# Altium footprint library Connectors FPC.PcbLib: 26 footprints (part 1 of 2)
Each footprint in its own frame and in the unit in brackets; x right, y up, seen from the top. Pads: shape width x height; smd on the part's side, far side on the other; paste and mask are expansions set on the pad; w line width, h text height; cw(c..) or ccw(c..) is an arc to the next point about the centre after c.
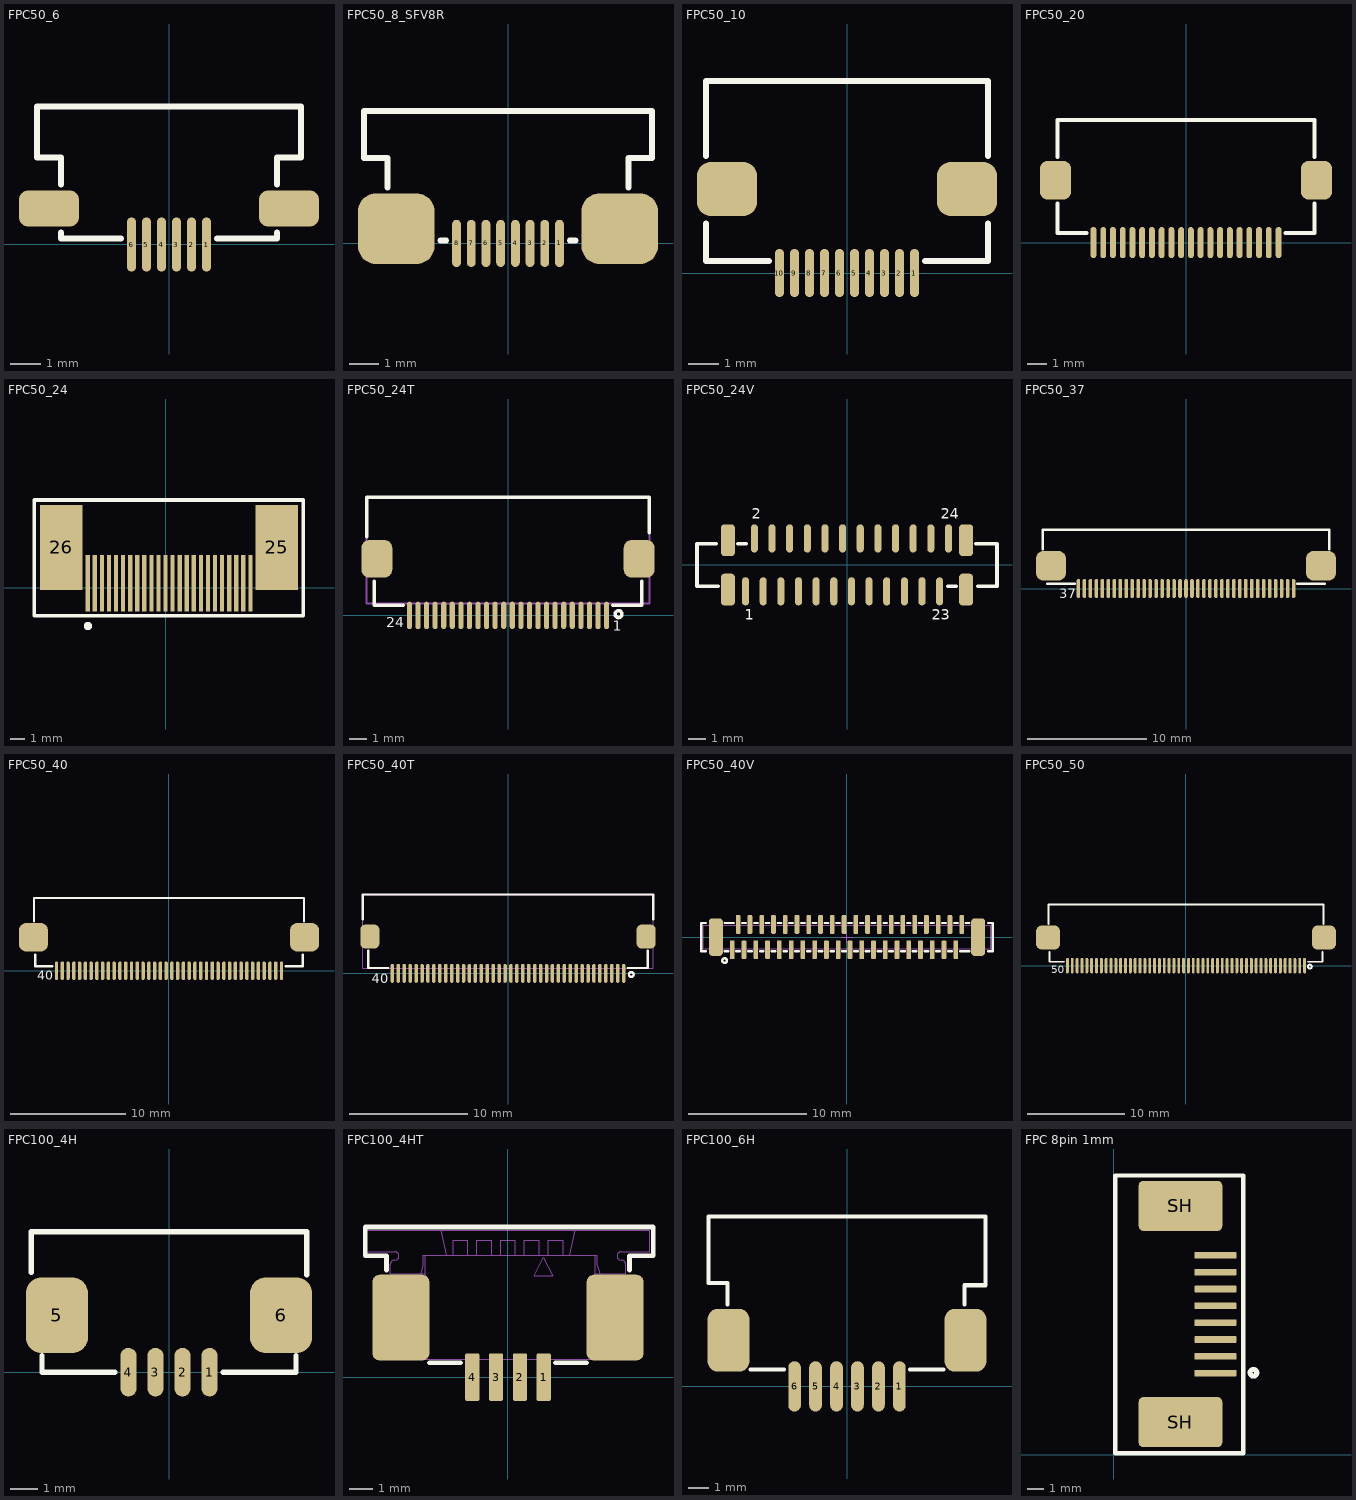
[diagram p0: the footprints below, top view; thin cyan lines are the x and y axes]

## FPC50_6 [mm] "FFC-FPC 6pin pitch: 0.5mm FCI SFV6R1STBE1HLF"
height 3
pads (8):
  oval 0.3x1.8 smd mask+0.075: 1(1.25,0) 2(0.75,0) 3(0.25,0) 4(-0.25,0) 5(-0.75,0) 6(-1.25,0)
  rrect50% 2x1.2 smd: ""(-4,1.2) ""(4,1.2)
Top Overlay:
  lines w0.2: -3.6,0.4 -3.6,0.2 -1.6,0.2 ; -3.6,2 -3.6,2.9 -4.4,2.9 -4.4,4.6 4.4,4.6 4.4,2.9 3.6,2.9 3.6,2 ; 1.6,0.2 3.6,0.2 3.6,0.4
3D body "sfv6r1stbe1hlf.stp": height 1.9, standoff 0.03, extent -4.25,-0.4 4.25,4.5

## FPC50_8_SFV8R [mm] "FPC 8pin pitch: 0.5mm FCI SFV8R-2STE1HLF"
pads (10):
  oval 0.3x1.6 smd mask+0.05: 1(1.75,0) 2(1.25,0) 3(0.75,0) 4(0.25,0) 5(-0.25,0) 6(-0.75,0) 7(-1.25,0) 8(-1.75,0)
  rrect50% 2.6x2.4 smd: ""(-3.8,0.5) ""(3.8,0.5)
Top Overlay:
  lines w0.2: -4.1,1.9 -4.1,2.9 -4.9,2.9 -4.9,4.5 4.9,4.5 4.9,2.9 4.1,2.9 4.1,1.9 ; -2.3,0.1 -2.1,0.1 ; 2.1,0.1 2.3,0.1
3D body "ssfv8r_2stlf.stp": height 1.82, standoff -0.05, extent -4.75,-0.5 4.75,4.4

## FPC50_10 [mm] "FPC, 0.50mm, SMT,RA Bot. Contact, WE 687110149022"
height 7.62
pads (12):
  oval 0.3x1.6 smd mask+0.05: 1(2.25,0) 2(1.75,0) 3(1.25,0) 4(0.75,0) 5(0.25,0) 6(-0.25,0) 7(-0.75,0) 8(-1.25,0) 9(-1.75,0) 10(-2.25,0)
  rrect50% 2x1.8 smd: ""(-4,2.8) ""(4,2.8)
Top Overlay:
  lines w0.2: -4.7,1.65 -4.7,0.4 -2.6,0.4 ; -4.7,3.9 -4.7,6.4 4.7,6.4 4.7,3.9 ; 2.6,0.4 4.7,0.4 4.7,1.65
3D body "687110149022.stp": height 2.25, standoff 0, extent -4.55,-0.225 4.55,6.275

## FPC50_20 [mm] "FH12-20S-0.5SH FFC-FPC pitch: 0.5mm"
height 3
pads (22):
  oval 0.3x1.6 smd mask+0.05: 1(4.75,0) 2(4.25,0) 3(3.75,0) 4(3.25,0) 5(2.75,0) 6(2.25,0) 7(1.75,0) 8(1.25,0) 9(0.75,0) 10(0.25,0) 11(-0.25,0) 12(-0.75,0) 13(-1.25,0) 14(-1.75,0) 15(-2.25,0) 16(-2.75,0) 17(-3.25,0) 18(-3.75,0) 19(-4.25,0) 20(-4.75,0)
  rrect50% 1.6x2 smd: ""(-6.7,3.2) ""(6.7,3.2)
Top Overlay:
  lines w0.2: -6.6,2 -6.6,0.5 -5.1,0.5 ; -6.6,4.4 -6.6,6.3 6.6,6.3 6.6,4.4 ; 5.1,0.5 6.6,0.5 6.6,2
3D body "FH12-20S-0.5SH.stp": height 2.14, standoff 0.04, extent -7.05,-0.2 7.05,6.2

## FPC50_24 [mm] "FPC, FH12 Series; 24 Position; 0.5mm, Bottom Contact, FH12F-24S-0.5SH"
pads (26):
  rect 0.3x4 smd: 1(-5.51,0.31) 2(-5.01,0.31) 3(-4.51,0.31) 4(-4.01,0.31) 5(-3.51,0.31) 6(-3.01,0.31) 7(-2.51,0.31) 8(-2.01,0.31) 9(-1.51,0.31) 10(-1.01,0.31) 11(-0.51,0.31) 12(-0.01,0.31) 13(0.49,0.31) 14(0.99,0.31) 15(1.49,0.31) 16(1.99,0.31) 17(2.49,0.31) 18(2.99,0.31) 19(3.49,0.31) 20(3.99,0.31) 21(4.49,0.31) 22(4.99,0.31) 23(5.49,0.31) 24(5.99,0.31)
  rect 3x6 smd: 25(7.84,2.86) 26(-7.37,2.86)
Top Overlay:
  circle w0.3: c-5.5,-2.7 r0.141
  lines w0.254: -9.3,-1.97 9.72,-1.97 9.72,6.21 -9.3,6.21 -9.3,-1.97
3D body "5603.stp": height 2, standoff -0.04, extent -9.08,-0.83 9.52,5.97

## FPC50_24T [mm] "Connector; FH12 Series; 24 Position; 0.5mm, Top Contact, FH12A-24S-0.5SH(55)"
height 2
pads (26):
  oval 0.3x1.6 smd mask+0.05: 1(5.75,0) 2(5.25,0) 3(4.75,0) 4(4.25,0) 5(3.75,0) 6(3.25,0) 7(2.75,0) 8(2.25,0) 9(1.75,0) 10(1.25,0) 11(0.75,0) 12(0.25,0) 13(-0.25,0) 14(-0.75,0) 15(-1.25,0) 16(-1.75,0) 17(-2.25,0) 18(-2.75,0) 19(-3.25,0) 20(-3.75,0) 21(-4.25,0) 22(-4.75,0) 23(-5.25,0) 24(-5.75,0)
  rrect50% 1.8x2.2 smd: ""(-7.65,3.3) ""(7.65,3.3)
Top Overlay:
  circle w0.2: c6.45,0.075 r0.2
  lines w0.2: -8.25,4.6 -8.25,6.9 8.25,6.9 8.25,4.825 ; -7.8,2 -7.8,0.6 -6.1,0.6 ; 6.1,0.6 7.8,0.6 7.8,2
  text "1" at 6.1,-0.9 h0.6
  text "24" at -7.1,-0.7 h0.6
Mechanical 13:
  lines w0.1: -8.25,0.7 8.25,0.7 8.25,6.9 -8.25,6.9 -8.25,0.7
3D body "FH12A-24S-0.5SH.stp": height 2.05, standoff -0.1, extent -8.25,-0.2 8.25,6.8

## FPC50_24V [mm] "Connector; FH12 Series; 24 Position; 0.5mm, Vertical, FH12-24S-0.5SV"
height 4.85
pads (28):
  oval 0.4x1.6 smd: 1(-5.75,-1.5) 2(-5.25,1.5) 3(-4.75,-1.5) 4(-4.25,1.5) 5(-3.75,-1.5) 6(-3.25,1.5) 7(-2.75,-1.5) 8(-2.25,1.5) 9(-1.75,-1.5) 10(-1.25,1.5) 11(-0.75,-1.5) 12(-0.25,1.5) 13(0.25,-1.5) 14(0.75,1.5) 15(1.25,-1.5) 16(1.75,1.5) 17(2.25,-1.5) 18(2.75,1.5) 19(3.25,-1.5) 20(3.75,1.5) 21(4.25,-1.5) 22(4.75,1.5) 23(5.25,-1.5) 24(5.75,1.5)
  rrect50% 0.8x1.8 smd: ""(-6.75,-1.4) ""(-6.75,1.4) ""(6.75,-1.4) ""(6.75,1.4)
Top Overlay:
  lines w0.2: -7.4,1.2 -8.5,1.2 -8.5,-1.2 -7.3,-1.2 ; -6.2,1.2 -5.7,1.2 ; 5.7,-1.2 6.2,-1.2 ; 7.3,1.2 8.5,1.2 8.5,-1.2 7.4,-1.2
  text "1" at -5.8,-3.1 h0.6
  text "2" at -5.4,2.6 h0.6
  text "24" at 5.3,2.6 h0.6
  text "23" at 4.8,-3.1 h0.6
3D body "FH12-24S-0.5SV.stp": height 5.48, standoff -0.03, extent -7.7,-1.8 7.7,2

## FPC50_37 [mm] "FPC, pitch: 0.5mm, TE 3-1734592-7"
height 3
pads (39):
  oval 0.3x1.6 smd mask+0.05: 1(9,0) 2(8.5,0) 3(8,0) 4(7.5,0) 5(7,0) 6(6.5,0) 7(6,0) 8(5.5,0) 9(5,0) 10(4.5,0) 11(4,0) 12(3.5,0) 13(3,0) 14(2.5,0) 15(2,0) 16(1.5,0) 17(1,0) 18(0.5,0) 19(0,0) 20(-0.5,0) 21(-1,0) 22(-1.5,0) 23(-2,0) 24(-2.5,0) 25(-3,0) 26(-3.5,0) 27(-4,0) 28(-4.5,0) 29(-5,0) 30(-5.5,0) 31(-6,0) 32(-6.5,0) 33(-7,0) 34(-7.5,0) 35(-8,0) 36(-8.5,0) 37(-9,0)
  rrect50% 2.5x2.5 smd: ""(-11.3,1.9) ""(11.3,1.9)
Top Overlay:
  lines w0.2: -12,3.3 -12,4.9 12,4.9 12,3.3 ; -11.6,0.4 -9.3,0.4 ; 9.3,0.4 11.6,0.4
  text "37" at -10.6,-0.8 h0.8
3D body "3-1734592-7.stp": height 2.05, standoff 0, extent -11.965,-0.3 11.965,4.81

## FPC50_40 [mm] "FPC, pitch: 0.5mm, FH12-40S-0.5SH, molex 54132-4062"
height 3
pads (42):
  oval 0.3x1.6 smd mask+0.05: 1(9.75,0) 2(9.25,0) 3(8.75,0) 4(8.25,0) 5(7.75,0) 6(7.25,0) 7(6.75,0) 8(6.25,0) 9(5.75,0) 10(5.25,0) 11(4.75,0) 12(4.25,0) 13(3.75,0) 14(3.25,0) 15(2.75,0) 16(2.25,0) 17(1.75,0) 18(1.25,0) 19(0.75,0) 20(0.25,0) 21(-0.25,0) 22(-0.75,0) 23(-1.25,0) 24(-1.75,0) 25(-2.25,0) 26(-2.75,0) 27(-3.25,0) 28(-3.75,0) 29(-4.25,0) 30(-4.75,0) 31(-5.25,0) 32(-5.75,0) 33(-6.25,0) 34(-6.75,0) 35(-7.25,0) 36(-7.75,0) 37(-8.25,0) 38(-8.75,0) 39(-9.25,0) 40(-9.75,0)
  rrect50% 2.5x2.5 smd: ""(-11.75,2.9) ""(11.75,2.9)
Top Overlay:
  lines w0.2: -11.7,4.3 -11.7,6.3 11.7,6.3 11.7,4.3 ; -11.6,1.4 -11.6,0.4 -10.1,0.4 ; 10.1,0.4 11.6,0.4 11.6,1.4
  text "40" at -11.4,-0.8 h0.8
3D body "FH12-40S-0.5SH.stp": height 2.09, standoff -0.01, extent -12.05,-0.3 12.05,6.1

## FPC50_40T [mm] "FPC, FH12 Series; 40 Position; 0.5mm, Top Contact"
height 2
pads (42):
  oval 0.3x1.6 smd mask+0.05: 1(9.75,0) 2(9.25,0) 3(8.75,0) 4(8.25,0) 5(7.75,0) 6(7.25,0) 7(6.75,0) 8(6.25,0) 9(5.75,0) 10(5.25,0) 11(4.75,0) 12(4.25,0) 13(3.75,0) 14(3.25,0) 15(2.75,0) 16(2.25,0) 17(1.75,0) 18(1.25,0) 19(0.75,0) 20(0.25,0) 21(-0.25,0) 22(-0.75,0) 23(-1.25,0) 24(-1.75,0) 25(-2.25,0) 26(-2.75,0) 27(-3.25,0) 28(-3.75,0) 29(-4.25,0) 30(-4.75,0) 31(-5.25,0) 32(-5.75,0) 33(-6.25,0) 34(-6.75,0) 35(-7.25,0) 36(-7.75,0) 37(-8.25,0) 38(-8.75,0) 39(-9.25,0) 40(-9.75,0)
  rrect50% 1.6x2 smd: ""(-11.65,3.1) ""(11.65,3.1)
Top Overlay:
  circle w0.2: c10.4,-0.1 r0.2
  lines w0.2: -12.25,4.57 -12.25,6.645 12.25,6.645 12.25,4.57 ; -11.8,1.9 -11.8,0.445 -10.1,0.445 ; 10.1,0.445 11.8,0.445 11.8,1.9
  text "40" at -11.5,-0.855 h0.8
Mechanical 13:
  lines w0.1: -12.25,0.445 -12.25,6.645 12.25,6.645 12.25,0.445 -12.25,0.445
3D body "FH12A-40S-0.5SH.stp": height 2.05, standoff -0.1, extent -12.25,-0.3 12.25,6.7

## FPC50_40V [mm] "FPC, FH12 Series; 40 Position; 0.5mm,Vertical, FH12-40S-0.5SVA"
pads (42):
  rrect50% 0.4x1.6 smd mask+0.1: 1(-9.75,-1.075) 2(-9.25,1.075) 3(-8.75,-1.075) 4(-8.25,1.075) 5(-7.75,-1.075) 6(-7.25,1.075) 7(-6.75,-1.075) 8(-6.25,1.075) 9(-5.75,-1.075) 10(-5.25,1.075) 11(-4.75,-1.075) 12(-4.25,1.075) 13(-3.75,-1.075) 14(-3.25,1.075) 15(-2.75,-1.075) 16(-2.25,1.075) 17(-1.75,-1.075) 18(-1.25,1.075) 19(-0.75,-1.075) 20(-0.25,1.075) 21(0.25,-1.075) 22(0.75,1.075) 23(1.25,-1.075) 24(1.75,1.075) 25(2.25,-1.075) 26(2.75,1.075) 27(3.25,-1.075) 28(3.75,1.075) 29(4.25,-1.075) 30(4.75,1.075) 31(5.25,-1.075) 32(5.75,1.075) 33(6.25,-1.075) 34(6.75,1.075) 35(7.25,-1.075) 36(7.75,1.075) 37(8.25,-1.075) 38(8.75,1.075) 39(9.25,-1.075) 40(9.75,1.075)
  rrect50% 1.2x3.2 smd: ""(-11.15,0) ""(11.15,0)
Top Overlay:
  circle w0.2: c-10.4,-2 r0.2
  lines w0.2: -12,-1.2 -12.4,-1.2 -12.4,1.2 -12,1.2 ; -10.4,-1.2 -10.1,-1.2 ; -10.4,1.2 -9.6,1.2 ; -9.4,-1.2 -9.1,-1.2 ; -8.9,1.2 -8.6,1.2 ; -8.4,-1.2 -8.1,-1.2 ; -7.9,1.2 -7.6,1.2 ; -7.4,-1.2 -7.1,-1.2 ; -6.9,1.2 -6.6,1.2 ; -6.4,-1.2 -6.1,-1.2 ; -5.9,1.2 -5.6,1.2 ; -5.4,-1.2 -5.1,-1.2 ; -4.9,1.2 -4.6,1.2 ; -4.4,-1.2 -4.1,-1.2 ; -3.9,1.2 -3.6,1.2 ; -3.4,-1.2 -3.1,-1.2 ; -2.9,1.2 -2.6,1.2 ; -2.4,-1.2 -2.1,-1.2 ; -1.9,1.2 -1.6,1.2 ; -1.4,-1.2 -1.1,-1.2 ; -0.9,1.2 -0.6,1.2 ; -0.4,-1.2 -0.1,-1.2 ; 0.1,1.2 0.4,1.2 ; 0.6,-1.2 0.9,-1.2 ; 1.1,1.2 1.4,1.2 ; 1.6,-1.2 1.9,-1.2 ; 2.1,1.2 2.4,1.2 ; 2.6,-1.2 2.9,-1.2 ; 3.1,1.2 3.4,1.2 ; 3.6,-1.2 3.9,-1.2 ; 4.1,1.2 4.4,1.2 ; 4.6,-1.2 4.9,-1.2 ; 5.1,1.2 5.4,1.2 ; 5.6,-1.2 5.9,-1.2 ; 6.1,1.2 6.4,1.2 ; 6.6,-1.2 6.9,-1.2 ; 7.1,1.2 7.4,1.2 ; 7.6,-1.2 7.9,-1.2 ; 8.1,1.2 8.4,1.2 ; 8.6,-1.2 8.9,-1.2 ; 9.1,1.2 9.4,1.2 ; 9.6,-1.2 10.4,-1.2 ; 10.1,1.2 10.4,1.2 ; 12,-1.2 12.4,-1.2 12.4,1.2 12,1.2
Mechanical 13:
  lines w0.1: -12.2,-1 -12.2,1 12.2,1 12.2,-1 -12.2,-1
Mechanical 15:
  lines w0.1: -0.5,0 0.5,0 ; 0,-0.5 0,0.5
3D body "ZIF connector.stp": height 4.47, standoff -0.02, extent -12.118,-1.454 12.182,1.483

## FPC50_50 [mm] "FPC, pitch: 0.5mm, FH12-50S-0.5SH"
height 3
pads (52):
  oval 0.3x1.6 smd mask+0.05: 1(12.25,0) 2(11.75,0) 3(11.25,0) 4(10.75,0) 5(10.25,0) 6(9.75,0) 7(9.25,0) 8(8.75,0) 9(8.25,0) 10(7.75,0) 11(7.25,0) 12(6.75,0) 13(6.25,0) 14(5.75,0) 15(5.25,0) 16(4.75,0) 17(4.25,0) 18(3.75,0) 19(3.25,0) 20(2.75,0) 21(2.25,0) 22(1.75,0) 23(1.25,0) 24(0.75,0) 25(0.25,0) 26(-0.25,0) 27(-0.75,0) 28(-1.25,0) 29(-1.75,0) 30(-2.25,0) 31(-2.75,0) 32(-3.25,0) 33(-3.75,0) 34(-4.25,0) 35(-4.75,0) 36(-5.25,0) 37(-5.75,0) 38(-6.25,0) 39(-6.75,0) 40(-7.25,0) 41(-7.75,0) 42(-8.25,0) 43(-8.75,0) 44(-9.25,0) 45(-9.75,0) 46(-10.25,0) 47(-10.75,0) 48(-11.25,0) 49(-11.75,0) 50(-12.25,0)
  rrect50% 2.5x2.5 smd: ""(-14.25,2.9) ""(14.25,2.9)
Top Overlay:
  circle w0.2: c12.8,-0.1 r0.2
  lines w0.2: -14.2,4.3 -14.2,6.3 14.2,6.3 14.2,4.3 ; -14.1,1.4 -14.1,0.4 -12.6,0.4 ; 12.6,0.4 14.1,0.4 14.1,1.4
  text "50" at -13.9,-0.8 h0.8
3D body "FH12-50S-0.5SH.stp": height 2.09, standoff -0.01, extent -14.55,-0.3 14.55,6.1

## FPC100_4H [mm] "FPC, 1mm, Horizental, Bot. Contact, Molex 200529-0040"
height 0.8
pads (6):
  oval 0.6x1.8 smd: 1(1.5,0) 2(0.5,0) 3(-0.5,0) 4(-1.5,0)
  rrect50% 2.3x2.8 smd: 5(-4.15,2.1) 6(4.15,2.1)
Top Overlay:
  lines w0.2: -5.1,3.7 -5.1,5.2 5.1,5.2 5.1,3.6 ; -4.7,0.6 -4.7,0 -2,0 ; 2,0 4.7,0 4.7,0.6
3D body "2005290040.stp": height 1.93, standoff -0.03, extent -5,-0.25 5,5.05

## FPC100_4HT [mm] "TE Connectivity 4-pin ZIF connector TE84953-4"
height 2.74
pads (6):
  rrect25% 0.6x2 smd: 1(1.5,0) 2(0.5,0) 3(-0.5,0) 4(-1.5,0)
  rrect25% 2.4x3.6 smd: ""(-4.5,2.5) ""(4.5,2.5)
Top Overlay:
  lines w0.2: -5.1,4.5 -5.1,5.1 -6,5.1 -6,6.3 6.1,6.3 6.1,5.1 5.1,5.1 5.1,4.5 ; -3.3,0.6 -2,0.6 ; 2,0.6 3.3,0.6
Mechanical 13:
  lines w0.05: -4.56,0.75 -4.56,4.25 -3.47,4.25 -3.47,5.12 ; -4.56,3.2 -4.18,3.2 ; -4.28,4.25 -4.18,3.877 -4.18,2.98 -3.93,2.98 ; -4.229,4.25 -4.232,4.26 -5.072,4.26 ccw(c-5.072,4.16) -5.172,4.16 -5.172,3.859 ccw(c-5.072,3.859) -5.072,3.759 -4.762,3.759 cw(c-4.762,3.659) -4.662,3.659 -4.662,3.357 cw(c-4.762,3.357) -4.762,3.257 -5.072,3.257 ccw(c-5.072,3.157) -5.172,3.157 -5.172,2.856 ccw(c-5.072,2.856) -5.072,2.756 -4.762,2.756 cw(c-4.762,2.656) -4.662,2.656 -4.662,2.355 cw(c-4.762,2.355) -4.762,2.255 -5.072,2.255 ccw(c-5.072,2.155) -5.172,2.155 -5.172,1.853 ccw(c-5.072,1.853) -5.072,1.753 -4.762,1.753 cw(c-4.762,1.653) -4.662,1.653 -4.662,1.352 cw(c-4.762,1.352) -4.762,1.252 -5.072,1.252 ccw(c-5.072,1.152) -5.172,1.152 -5.172,0.85 ccw(c-5.072,0.85) -5.072,0.75 5.072,0.75 ccw(c5.072,0.85) 5.172,0.85 5.172,1.152 ccw(c5.072,1.152) 5.072,1.252 4.762,1.252 cw(c4.762,1.352) 4.662,1.352 4.662,1.653 cw(c4.762,1.653) 4.762,1.753 5.072,1.753 ccw(c5.072,1.853) 5.172,1.853 5.172,2.155 ccw(c5.072,2.155) 5.072,2.255 4.762,2.255 cw(c4.762,2.355) 4.662,2.355 4.662,2.656 cw(c4.762,2.656) 4.762,2.756 5.072,2.756 ccw(c5.072,2.856) 5.172,2.856 5.172,3.157 ccw(c5.072,3.157) 5.072,3.257 4.762,3.257 cw(c4.762,3.357) 4.662,3.357 4.662,3.659 cw(c4.762,3.659) 4.762,3.759 5.072,3.759 ccw(c5.072,3.859) 5.172,3.859 5.172,4.16 ccw(c5.072,4.16) 5.072,4.26 3.982,4.26 3.982,4.25 ; -3.93,0.75 -3.93,3.877 -3.83,4.25 ; -3.646,4.33 -3.55,4.69 -3.55,5.12 3.75,5.12 3.75,4.69 3.847,4.33 ; -3.47,4.33 -4.94,4.33 -4.94,4.73 cw(c-4.76,4.73) -4.76,4.91 ccw(c-4.76,5.09) -4.76,5.27 -5.96,5.27 -5.96,6.16 5.96,6.16 5.96,5.27 4.76,5.27 ccw(c4.76,5.09) 4.76,4.91 cw(c4.76,4.73) 4.94,4.73 4.94,4.33 3.67,4.33 ; -2.82,6.16 -2.59,5.12 ; -2.309,5.12 -2.309,5.75 -1.689,5.75 -1.689,5.12 ; -1.604,-0.26 -1.404,-0.26 ; -1.604,0.11 -1.404,0.11 ; -1.604,0.24 -1.404,0.24 ; -1.604,0.75 -1.604,-0.39 -1.404,-0.39 -1.404,0.75 ; -1.309,5.12 -1.309,5.75 -0.689,5.75 -0.689,5.12 ; -0.604,-0.26 -0.404,-0.26 ; -0.604,0.11 -0.404,0.11 ; -0.604,0.24 -0.404,0.24 ; -0.604,0.75 -0.604,-0.39 -0.404,-0.39 -0.404,0.75 ; -0.309,5.12 -0.309,5.75 0.311,5.75 0.311,5.12 ; 0.396,-0.26 0.596,-0.26 ; 0.396,0.11 0.596,0.11 ; 0.396,0.24 0.596,0.24 ; 0.396,0.75 0.396,-0.39 0.596,-0.39 0.596,0.75 ; 0.691,5.12 0.691,5.75 1.311,5.75 1.311,5.12 ; 1.396,-0.26 1.596,-0.26 ; 1.396,0.11 1.596,0.11 ; 1.396,0.24 1.596,0.24 ; 1.396,0.75 1.396,-0.39 1.596,-0.39 1.596,0.75 ; 1.691,5.12 1.691,5.75 2.311,5.75 2.311,5.12 ; 2.59,5.12 2.82,6.16 ; 3.67,5.12 3.67,4.25 4.56,4.25 4.56,0.75 ; 3.83,0.75 3.93,1.123 3.93,4.25 ; 3.93,2.02 4.56,2.02 ; 4.18,2.02 4.18,1.123 4.28,0.75 ; 4.18,4.25 4.18,4.26 ; 1.111,4.25 1.871,4.25 1.491,5.01 1.111,4.25
3D body "ZIF Conn TE 84953-4.STEP": height 2.58, standoff 0, extent -5.96,-0.39 5.96,6.16

## FPC100_6H [mm] "FPC 6pin pitch: 1.0mm, Molex 52271-0679"
height 3
pads (8):
  oval 0.6x2.4 smd: 1(2.5,0) 2(1.5,0) 3(0.5,0) 4(-0.5,0) 5(-1.5,0) 6(-2.5,0)
  rrect50% 2x3 smd: ""(-5.65,2.2) ""(5.65,2.2)
Top Overlay:
  lines w0.2: -5.7,3.9 -5.7,4.925 -6.6,4.925 -6.6,8.1 6.6,8.1 6.6,4.825 5.6,4.825 5.6,3.9 ; -4.6,0.8 -3,0.8 ; 3,0.8 4.6,0.8
3D body "522710679.stp": height 3, standoff 0, extent -6.5,-0.7 6.5,8

## FPC 8pin 1mm [mm] "FPC connector 8pin 1mm"
pads (10):
  rrect20% 2.5x0.4 smd: 1(6.081,4.867) 2(6.081,5.872) 3(6.081,6.876) 4(6.081,7.881) 5(6.081,8.886) 6(6.081,9.891) 7(6.081,10.895) 8(6.081,11.9)
  rrect20% 5x3 smd: SH(3.996,1.943) SH(3.996,14.851)
Top Overlay:
  lines w0.254: 0.098,0.088 0.098,16.661 7.75,16.661 7.75,0.088 0.098,0.088
  lines w0.3: 8.541,4.961 ccw(c8.355,4.887) 8.555,4.897
3D body "19r9649_84952-8.stp": height 2.54, standoff -0.02, extent 0.412,0.431 6.952,16.361